# Altium footprint library PcbLib_jp.PcbLib: 255 footprints (part 1 of 16)
Each footprint in its own frame and in the unit in brackets; x right, y up, seen from the top. Pads: shape width x height; smd on the part's side, far side on the other; paste and mask are expansions set on the pad; w line width, h text height; cw(c..) or ccw(c..) is an arc to the next point about the centre after c.
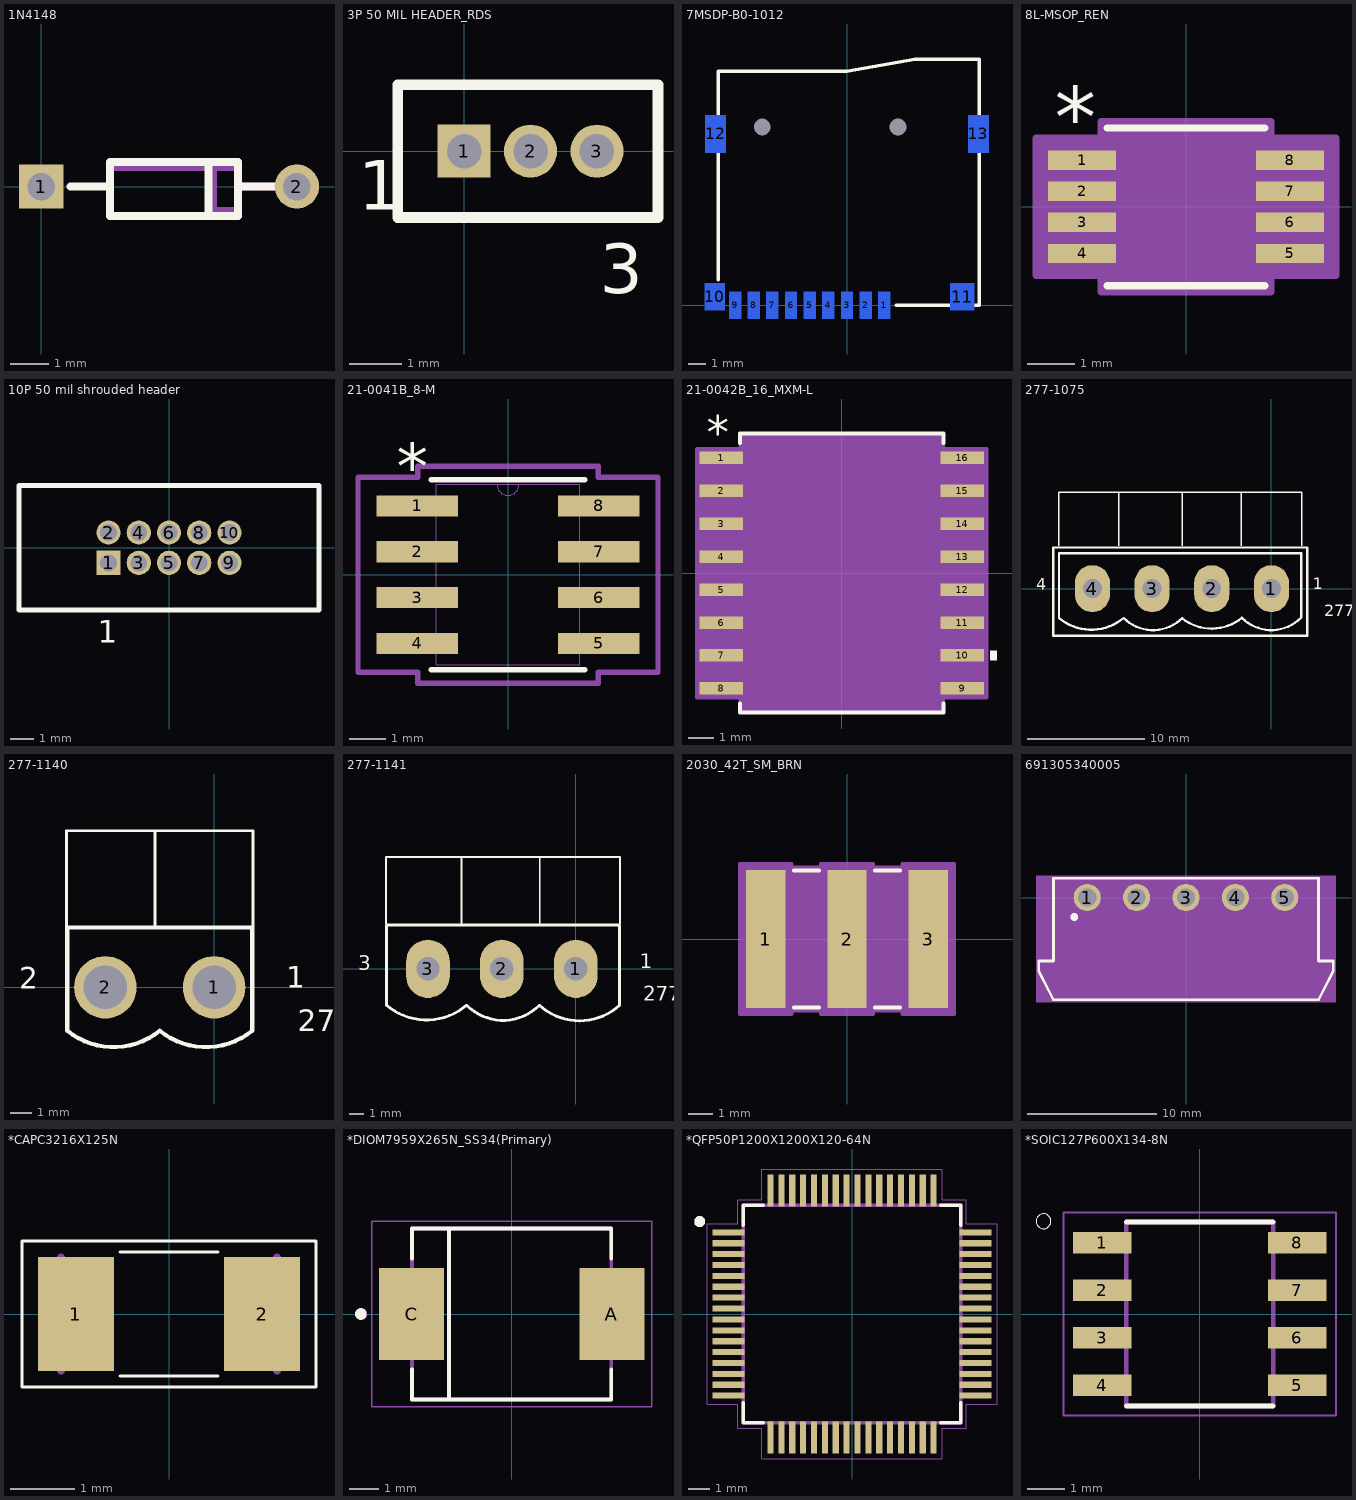
[diagram p0: the footprints below, top view; thin cyan lines are the x and y axes]

## 1N4148 [mil]
pads (2):
  rect 45x45 / inner round 60 / far side rect 45x45 hole 28: 1(0,0)
  round 45 / inner round 60 / far side round 45 hole 28: 2(260,0)
Top Overlay:
  lines w8: 30,0 70,0 ; 125,25 170,25 170,-30 ; 200,0 255,0 ; 70,-30 200,-30 200,-25 200,25 70,25 70,-30
Mechanical 1:
  lines w8: 200,0 255,0 ; 175,25 200,25 ; 175,25 175,-30 200,-30 ; 175,25 200,25 ; 175,25 175,-25 200,-25 ; 200,-30 70,-30 70,20 200,20 200,-25 ; 200,-30 200,-25 ; 200,-30 200,25 ; 200,-25 200,25
3D body "User Library-1N4007 x7mm.STEP": height 51.57, standoff -153.54, extent -26.54,-52.57 280.54,50.57

## 3P 50 MIL HEADER_RDS [mil]
height 137.8
pads (3):
  rect 40x40 hole 26: 1(0,0)
  round 40 hole 26: 2(50,0) 3(100,0)
Top Overlay:
  lines w8: -50,-50 -50,50 146,50 146,-50 -50,-50
  text "3" at 102,-107 h37.5
  text "1" at -80,-44 h37.5
3D body "SLM-103-01-G-S.stp": height 179, standoff -116, extent -30,-50 129,50

## 7MSDP-B0-1012 [mm] "Micro SD Card Socket"
height 3.9
pads (15):
  rect 0.7x1.6 smd far side: 1(2.2,0) 2(1.1,0) 3(0,0) 4(-1.1,0) 5(-2.2,0) 6(-3.3,0) 7(-4.4,0) 8(-5.5,0) 9(-6.6,0)
  rect 1.2x1.6 smd far side: 10(-7.8,0.5)
  rect 1.4x1.6 smd far side: 11(6.8,0.5)
  rect 1.2x2.2 smd far side: 12(-7.75,10.1) 13(7.75,10.1)
  round 0.8 hole 1: ""(-5,10.5) ""(3,10.5)
Top Overlay:
  lines w0.2: -7.6,1.5 -7.6,13.8 0,13.8 4,14.5 7.8,14.5 7.8,0 2.9,0
3D body "User Library-MEM2055-00-190-01-A_revG.STEP": height 1.85, standoff -0.6, extent -8,-0.8 8,14.45

## 8L-MSOP_REN [mil]
pads (8):
  rect 56x16 smd paste+0 mask+0: 1(-85.5,38.39) 2(-85.5,12.8) 3(-85.5,-12.8) 4(-85.5,-38.39) 5(85.5,-38.39) 6(85.5,-12.8) 7(85.5,12.8) 8(85.5,38.39)
Top Overlay:
  lines w6: -65,-65 65,-65 ; -65,65 65,65
  text "*" at -108,49.39 h50
Mechanical 13:
  lines w0: -12,60 ccw(c0,60) 12,60
  lines w1: -99.5,-45.39 -99.5,-31.39 -60,-31.39 -60,-45.39 -99.5,-45.39 ; -99.5,-19.8 -99.5,-5.8 -60,-5.8 -60,-19.8 -99.5,-19.8 ; -99.5,5.8 -99.5,19.8 -60,19.8 -60,5.8 -99.5,5.8 ; -99.5,31.39 -99.5,45.39 -60,45.39 -60,31.39 -99.5,31.39 ; -60,-60 60,-60 60,60 -60,60 -60,-60 ; 60,-45.39 60,-31.39 99.5,-31.39 99.5,-45.39 60,-45.39 ; 60,-19.8 60,-5.8 99.5,-5.8 99.5,-19.8 60,-19.8 ; 60,5.8 60,19.8 99.5,19.8 99.5,5.8 60,5.8 ; 60,31.39 60,45.39 99.5,45.39 99.5,31.39 60,31.39
  text "*" at -57.5,7 h50
Mechanical 15:
  region: -70,-56.39 -123.5,-56.39 -123.5,56.39 -70,56.39 -70,70 70,70 70,56.39 123.5,56.39 123.5,-56.39 70,-56.39 70,-70 -70,-70
  lines w6: -123.5,-56.39 -123.5,56.39 -70,56.39 -70,70 70,70 70,56.39 123.5,56.39 123.5,-56.39 70,-56.39 70,-70 -70,-70 -70,-56.39 -123.5,-56.39
3D body "8L-MSOP_REN.step": height 43.11, standoff 0, extent -99.49,-60 99.49,60

## 10P 50 mil shrouded header [mil]
height 137.8
pads (10):
  rect 40x40 hole 28: 1(-100,-25)
  round 40 hole 28: 2(-100,25) 3(-50,-25) 4(-50,25) 5(0,-25) 6(0,25) 7(50,-25) 8(50,25) 9(100,-25) 10(100,25)
Top Overlay:
  lines w8: -248,-103 -248,103 248,103 248,-103 -248,-103
  text "1" at -118,-157 h37.5

## 21-0041B_8-M [mm]
pads (8):
  rect 2.27x0.583 smd paste+0 mask+0: 1(-2.514,1.905) 2(-2.514,0.635) 3(-2.514,-0.635) 4(-2.514,-1.905) 5(2.514,-1.905) 6(2.514,-0.635) 7(2.514,0.635) 8(2.514,1.905)
Top Overlay:
  lines w0.152: -2.121,-2.629 2.121,-2.629 ; -2.121,2.629 2.121,2.629
  text "*" at -3.085,2.361 h1.27
Mechanical 13:
  lines w0: -0.305,2.502 ccw(c0,2.502) 0.305,2.502
  lines w0.025: -3.099,-2.146 -3.099,-1.664 -1.994,-1.664 -1.994,-2.146 -3.099,-2.146 ; -3.099,-0.876 -3.099,-0.394 -1.994,-0.394 -1.994,-0.876 -3.099,-0.876 ; -3.099,0.394 -3.099,0.876 -1.994,0.876 -1.994,0.394 -3.099,0.394 ; -3.099,1.664 -3.099,2.146 -1.994,2.146 -1.994,1.664 -3.099,1.664 ; -1.994,-2.502 1.994,-2.502 1.994,2.502 -1.994,2.502 -1.994,-2.502 ; 1.994,-2.146 1.994,-1.664 3.099,-1.664 3.099,-2.146 1.994,-2.146 ; 1.994,-0.876 1.994,-0.394 3.099,-0.394 3.099,-0.876 1.994,-0.876 ; 1.994,0.394 1.994,0.876 3.099,0.876 3.099,0.394 1.994,0.394 ; 1.994,1.664 1.994,2.146 3.099,2.146 3.099,1.664 1.994,1.664
  text "*" at -1.93,1.156 h1.27
Mechanical 15:
  lines w0.152: -2.502,2.704 -2.502,3.01
Mechanical 16:
  lines w0.152: -2.502,2.704 -4.157,2.704 -4.157,-2.704 -2.502,-2.704 -2.502,-3.01 2.502,-3.01 2.502,-2.704 4.157,-2.704 4.157,2.704 2.502,2.704 2.502,3.01 -2.502,3.01
3D body "21-0041B_8-M.step": height 1.76, standoff 0, extent -3.226,-2.502 2.972,2.502
3D body: height 0.25, standoff 0, extent 0,0 0.254,0.254

## 21-0042B_16_MXM-L [mil]
pads (16):
  rect 66x19 smd paste+0 mask+0: 1(-182.5,175) 2(-182.5,125) 3(-182.5,75) 4(-182.5,25) 5(-182.5,-25) 6(-182.5,-75) 7(-182.5,-125) 8(-182.5,-175) 9(182.5,-175) 10(182.5,-125) 11(182.5,-75) 12(182.5,-25) 13(182.5,25) 14(182.5,75) 15(182.5,125) 16(182.5,175)
Top Overlay:
  region: 225.5,-117.5 235.5,-117.5 235.5,-132.5 225.5,-132.5
  lines w6: -154.5,-197.6 -154.5,-211.5 154.5,-211.5 154.5,-197.6 ; -154.5,197.6 -154.5,211.5 154.5,211.5 154.5,197.6
  text "*" at -205,189 h50
Mechanical 13:
  lines w0: -12,206.5 ccw(c0,206.5) 12,206.5
  lines w1: -209.5,-184.5 -149.5,-184.5 -149.5,-165.5 -209.5,-165.5 -209.5,-184.5 ; -209.5,-134.5 -149.5,-134.5 -149.5,-115.5 -209.5,-115.5 -209.5,-134.5 ; -209.5,-84.5 -149.5,-84.5 -149.5,-65.5 -209.5,-65.5 -209.5,-84.5 ; -209.5,-34.5 -149.5,-34.5 -149.5,-15.5 -209.5,-15.5 -209.5,-34.5 ; -209.5,15.5 -149.5,15.5 -149.5,34.5 -209.5,34.5 -209.5,15.5 ; -209.5,65.5 -149.5,65.5 -149.5,84.5 -209.5,84.5 -209.5,65.5 ; -209.5,115.5 -149.5,115.5 -149.5,134.5 -209.5,134.5 -209.5,115.5 ; -209.5,165.5 -149.5,165.5 -149.5,184.5 -209.5,184.5 -209.5,165.5 ; -149.5,-206.5 -149.5,206.5 149.5,206.5 149.5,-206.5 -149.5,-206.5 ; 149.5,-184.5 209.5,-184.5 209.5,-165.5 149.5,-165.5 149.5,-184.5 ; 149.5,-134.5 209.5,-134.5 209.5,-115.5 149.5,-115.5 149.5,-134.5 ; 149.5,-84.5 209.5,-84.5 209.5,-65.5 149.5,-65.5 149.5,-84.5 ; 149.5,-34.5 209.5,-34.5 209.5,-15.5 149.5,-15.5 149.5,-34.5 ; 149.5,15.5 209.5,15.5 209.5,34.5 149.5,34.5 149.5,15.5 ; 149.5,65.5 209.5,65.5 209.5,84.5 149.5,84.5 149.5,65.5 ; 149.5,115.5 209.5,115.5 209.5,134.5 149.5,134.5 149.5,115.5 ; 149.5,165.5 209.5,165.5 209.5,184.5 149.5,184.5 149.5,165.5
  text "*" at -147,153.5 h50
Mechanical 15:
  region: -153.5,-188.5 -219.5,-188.5 -219.5,188.5 -153.5,188.5 -153.5,210.5 153.5,210.5 153.5,188.5 219.5,188.5 219.5,-188.5 153.5,-188.5 153.5,-210.5 -153.5,-210.5
  lines w6: -219.5,-188.5 -153.5,-188.5 -153.5,-210.5 153.5,-210.5 153.5,-188.5 219.5,-188.5 219.5,188.5 153.5,188.5 153.5,210.5 -153.5,210.5 -153.5,188.5 -219.5,188.5 -219.5,-188.5
3D body "21-0042B_16_MXM.step": height 104.09, standoff 0, extent -209.49,-206.5 209.49,206.5

## 277-1075 [mm] "TERM BLOCK HDR 3POS"
pads (4):
  oval 3x4 hole 1.6: 1(0,0)
  oval 3x4 / inner round 1.524 / far side round 2.794 hole 1.6: 2(-5.08,0) 3(-10.16,0) 4(-15.24,0)
Top Overlay:
  lines w0.127: -18.117,3.63 -18.117,8.19 2.578,8.19 2.578,3.63 ; -12.995,3.63 -12.995,8.17 ; -7.595,3.63 -7.595,8.17 ; -2.555,3.63 -2.555,8.17
  lines w0.203: -7.603,-2.529 ccw(c-5.084,0.666) -2.512,-2.487 ccw(c0,0) 2.5,-2.5 ; -7.58,-2.5 cw(c-10.08,0) -12.579,-2.5 cw(c-15.329,0.75) -18.079,-2.5 -18.079,3 2.54,3 2.54,0.528 2.54,-2.051 2.54,-2.452 ; -18.579,-4 3.048,-4 3.048,3.5 -18.579,3.5 -18.579,-4
  text "1" at 3.505,-0.051 h1
  text "277-1075" at 4.5,-2.34 h1
  text "4" at -20.041,-0.102 h1
3D body "1758034.stp": height 12, standoff -3.9, extent -17.831,-4.013 2.489,4.587

## 277-1140 [mil] "TERM BLOCK 2POS"
pads (2):
  round 115 / inner round 60 / far side round 115 hole 80: 1(0,0) 2(-200,0)
Top Overlay:
  lines w5: -271.5,109.06 -271.5,287.8 71.5,287.8 71.5,109.06 ; -108.86,109.06 -108.86,287.8
  lines w8: -270,-80 ccw(c-185,25) -100,-80 ccw(c-15,25) 70,-80 70,110 -270,110 -270,-80
  text "277-1140" at 153.54,-80.71 h39.37
  text "2" at -359,-3 h39.37
  text "1" at 133,-1 h39.37
3D body "2059808_284514-2.stp": height 374.02, standoff -122.05, extent -275.16,-147.43 79.16,138

## 277-1141 [mm] "TERM BLOCK HDR 3POS"
pads (3):
  oval 3x4 / inner round 1.524 / far side round 2.794 hole 1.6: 1(0,0) 2(-5.08,0) 3(-10.16,0)
Top Overlay:
  lines w0.127: -13.037,3.11 -13.037,7.67 3.02,7.67 3.038,7.652 3.038,3.11 ; -7.865,3.11 -7.865,7.65 ; -2.475,3.11 -2.475,7.65
  lines w0.203: -12.999,-2.5 ccw(c-10.249,0.75) -7.499,-2.5 ccw(c-5,0) -2.5,-2.5 ccw(c0.25,0.5) 3,-2.5 3,3 -12.999,3 -12.999,-2.5
  text "277-1141" at 4.64,-2.19 h1
  text "3" at -14.961,-0.102 h1
  text "1" at 4.394,0.051 h1
3D body "2059780_796636-3.stp": height 12, standoff -3.5, extent -13.534,-4.896 3.526,3.454

## 2030_42T_SM_BRN [mil]
pads (3):
  rect 63x220 smd paste+0 mask+0: 1(-129.92,0) 2(0,0) 3(129.92,0)
Top Overlay:
  lines w6: -85.32,-109.5 -44.6,-109.5 ; -85.32,109.5 -44.6,109.5 ; 44.6,-109.5 85.32,-109.5 ; 44.6,109.5 85.32,109.5
Mechanical 13:
  lines w1: -151.5,-104.5 -151.5,104.5 151.5,104.5 151.5,-104.5 -151.5,-104.5
Mechanical 15:
  region: 151.5,-104.5 -151.5,-104.5 -151.5,104.5 151.5,104.5
  region: -171.42,-120 -171.42,120 -88.42,120 -88.42,114.5 -41.5,114.5 -41.5,120 41.5,120 41.5,114.5 88.42,114.5 88.42,120 171.42,120 171.42,-120 88.42,-120 88.42,-114.5 41.5,-114.5 41.5,-120 -41.5,-120 -41.5,-114.5 -88.42,-114.5 -88.42,-120
  lines w6: -171.42,-120 -88.42,-120 -88.42,-114.5 -41.5,-114.5 -41.5,-120 41.5,-120 41.5,-114.5 88.42,-114.5 88.42,-120 171.42,-120 171.42,120 88.42,120 88.42,114.5 41.5,114.5 41.5,120 -41.5,120 -41.5,114.5 -88.42,114.5 -88.42,120 -171.42,120 -171.42,-120
3D body: height 10, standoff 0, extent 0,0 10,10

## 691305340005 [mm]
pads (5):
  round 2.1 hole 1.4: 1(-7.62,0) 2(-3.81,0) 3(0,0) 4(3.81,0) 5(7.62,0)
Top Overlay:
  circle w0.4: c-8.615,-1.5 r0.1
  lines w0.2: -11.375,-5.7 -11.375,-4.9 -10.225,-4.9 -10.225,1.5 10.225,1.5 10.225,-4.9 11.375,-4.9 11.375,-5.7 10.225,-7.9 -10.225,-7.9 -11.375,-5.7
Mechanical 13:
  lines w0.1: -11.275,-5.65 -11.275,-5 -10.125,-5 -10.125,1.4 10.125,1.4 10.125,-5 11.275,-5 11.275,-5.65 10.125,-7.8 -10.125,-7.8 -11.275,-5.65
Mechanical 15:
  region: 11.575,-8.1 -11.575,-8.1 -11.575,1.7 11.575,1.7
3D body "691305340005.stp": height 6.39, standoff -4.31, extent -11.143,-7.747 11.397,1.453

## *CAPC3216X125N [mm]
pads (2):
  rect 1.18x1.77 smd: 1(-1.445,0) 2(1.445,0)
Top Overlay:
  lines w0.05: -0.762,-0.965 0.762,-0.965 ; -0.762,0.965 0.762,0.965 ; -2.285,-1.135 2.285,-1.135 2.285,1.135 -2.285,1.135 -2.285,-1.135
Mechanical 13:
  lines w0.127: -1.68,-0.88 -1.68,0.88 -1.68,-0.88 ; 1.68,-0.88 1.68,0.88 1.68,-0.88
3D body "c1206c106k4ractu.stp": height 2, standoff 0.2, extent -1.725,-0.889 1.675,0.911

## *DIOM7959X265N_SS34(Primary) [mm]
pads (2):
  rect 2.25x3.18 smd: A(3.455,0) C(-3.455,0)
Top Overlay:
  circle w0.2: c-5.2,0 r0.1
  lines w0.127: -3.437,-1.91 -3.437,-2.95 3.437,-2.95 3.437,-1.91 ; -3.437,1.91 -3.437,2.95 3.437,2.95 3.437,1.91 ; -2.159,-2.921 -2.159,2.946
Mechanical 13:
  circle w0.2: c-5.2,0 r0.1
  circle w0.2: c-5.2,0 r0.1
  lines w0.127: -3.437,-2.95 -3.437,2.95 ; -3.437,-2.95 3.437,-2.95 ; -3.437,-2.95 -3.437,2.95 ; -3.437,-2.95 3.437,-2.95 ; -3.437,2.95 3.437,2.95 ; -3.437,2.95 3.437,2.95 ; 3.437,-2.95 3.437,2.95 ; 3.437,-2.95 3.437,2.95
Mechanical 16:
  lines w0.05: -4.83,-3.2 4.83,-3.2 4.83,3.2 -4.83,3.2 -4.83,-3.2

## *QFP50P1200X1200X120-64N [mm]
pads (64):
  rect 1.47x0.28 smd: 1(-5.67,3.75) 2(-5.67,3.25) 3(-5.67,2.75) 4(-5.67,2.25) 5(-5.67,1.75) 6(-5.67,1.25) 7(-5.67,0.75) 8(-5.67,0.25) 9(-5.67,-0.25) 10(-5.67,-0.75) 11(-5.67,-1.25) 12(-5.67,-1.75) 13(-5.67,-2.25) 14(-5.67,-2.75) 15(-5.67,-3.25) 16(-5.67,-3.75) 33(5.67,-3.75) 34(5.67,-3.25) 35(5.67,-2.75) 36(5.67,-2.25) 37(5.67,-1.75) 38(5.67,-1.25) 39(5.67,-0.75) 40(5.67,-0.25) 41(5.67,0.25) 42(5.67,0.75) 43(5.67,1.25) 44(5.67,1.75) 45(5.67,2.25) 46(5.67,2.75) 47(5.67,3.25) 48(5.67,3.75)
  rect 0.28x1.47 smd: 17(-3.75,-5.67) 18(-3.25,-5.67) 19(-2.75,-5.67) 20(-2.25,-5.67) 21(-1.75,-5.67) 22(-1.25,-5.67) 23(-0.75,-5.67) 24(-0.25,-5.67) 25(0.25,-5.67) 26(0.75,-5.677) 27(1.25,-5.67) 28(1.75,-5.67) 29(2.25,-5.67) 30(2.75,-5.67) 31(3.25,-5.67) 32(3.75,-5.67) 49(3.75,5.67) 50(3.25,5.67) 51(2.75,5.67) 52(2.25,5.67) 53(1.75,5.67) 54(1.25,5.67) 55(0.75,5.67) 56(0.25,5.67) 57(-0.25,5.67) 58(-0.75,5.67) 59(-1.25,5.67) 60(-1.75,5.67) 61(-2.25,5.67) 62(-2.75,5.67) 63(-3.25,5.67) 64(-3.75,5.67)
Top Overlay:
  circle w0.25: c-7,4.25 r0.125
  lines w0.152: -5,-4.07 -5,-5 -4.07,-5 ; -5,4.07 -5,5 -4.07,5 ; 4.07,-5 5,-5 5,-4.07 ; 4.07,5 5,5 5,4.07
Mechanical 13:
  circle w0.25: c-7,4.25 r0.125
  circle w0.25: c-7,4.25 r0.125
  lines w0.152: -5,-5 -5,5 ; -5,-5 5,-5 ; -5,-5 -5,5 ; -5,-5 5,-5 ; -5,5 5,5 ; -5,5 5,5 ; 5,-5 5,5 ; 5,-5 5,5
Mechanical 16:
  lines w0.05: -6.66,-4.14 -6.66,4.14 -5.25,4.14 -5.25,5.25 -4.14,5.25 -4.14,6.66 4.14,6.66 4.14,5.25 5.25,5.25 5.25,4.14 6.66,4.14 6.66,-4.14 5.25,-4.14 5.25,-5.25 4.14,-5.25 4.14,-6.66 -4.14,-6.66 -4.14,-5.25 -5.25,-5.25 -5.25,-4.14 -6.66,-4.14
3D body "User Library-TQFP64-2.STEP": height 1.53, standoff 0.33, extent -6.1,-6.125 6.1,6.075

## *SOIC127P600X134-8N [mm]
pads (8):
  rect 1.57x0.58 smd: 1(-2.615,1.905) 2(-2.615,0.635) 3(-2.615,-0.635) 4(-2.615,-1.905) 5(2.615,-1.905) 6(2.615,-0.635) 7(2.615,0.635) 8(2.615,1.905)
Top Overlay:
  circle w0: c-4.185,2.485 r0.2
  lines w0.127: -1.968,-2.464 1.968,-2.464 ; -1.968,2.464 1.968,2.464
Mechanical 13:
  circle w0: c-4.185,2.485 r0.2
  circle w0: c-4.185,2.485 r0.2
  lines w0.127: -1.968,-2.464 1.968,-2.464 ; -1.968,-2.464 -1.968,2.464 ; -1.968,-2.464 1.968,-2.464 ; -1.968,-2.464 -1.968,2.464 ; -1.968,2.464 1.968,2.464 ; -1.968,2.464 1.968,2.464 ; 1.968,-2.464 1.968,2.464 ; 1.968,-2.464 1.968,2.464
Mechanical 16:
  lines w0.05: -3.65,-2.714 3.65,-2.714 3.65,2.714 -3.65,2.714 -3.65,-2.714